# Altium integrated library Mylib Rev 4.IntLib: 207 symbols (part 1 of 3)
Pins are listed as number, name and electrical type; pins without a type are passive.

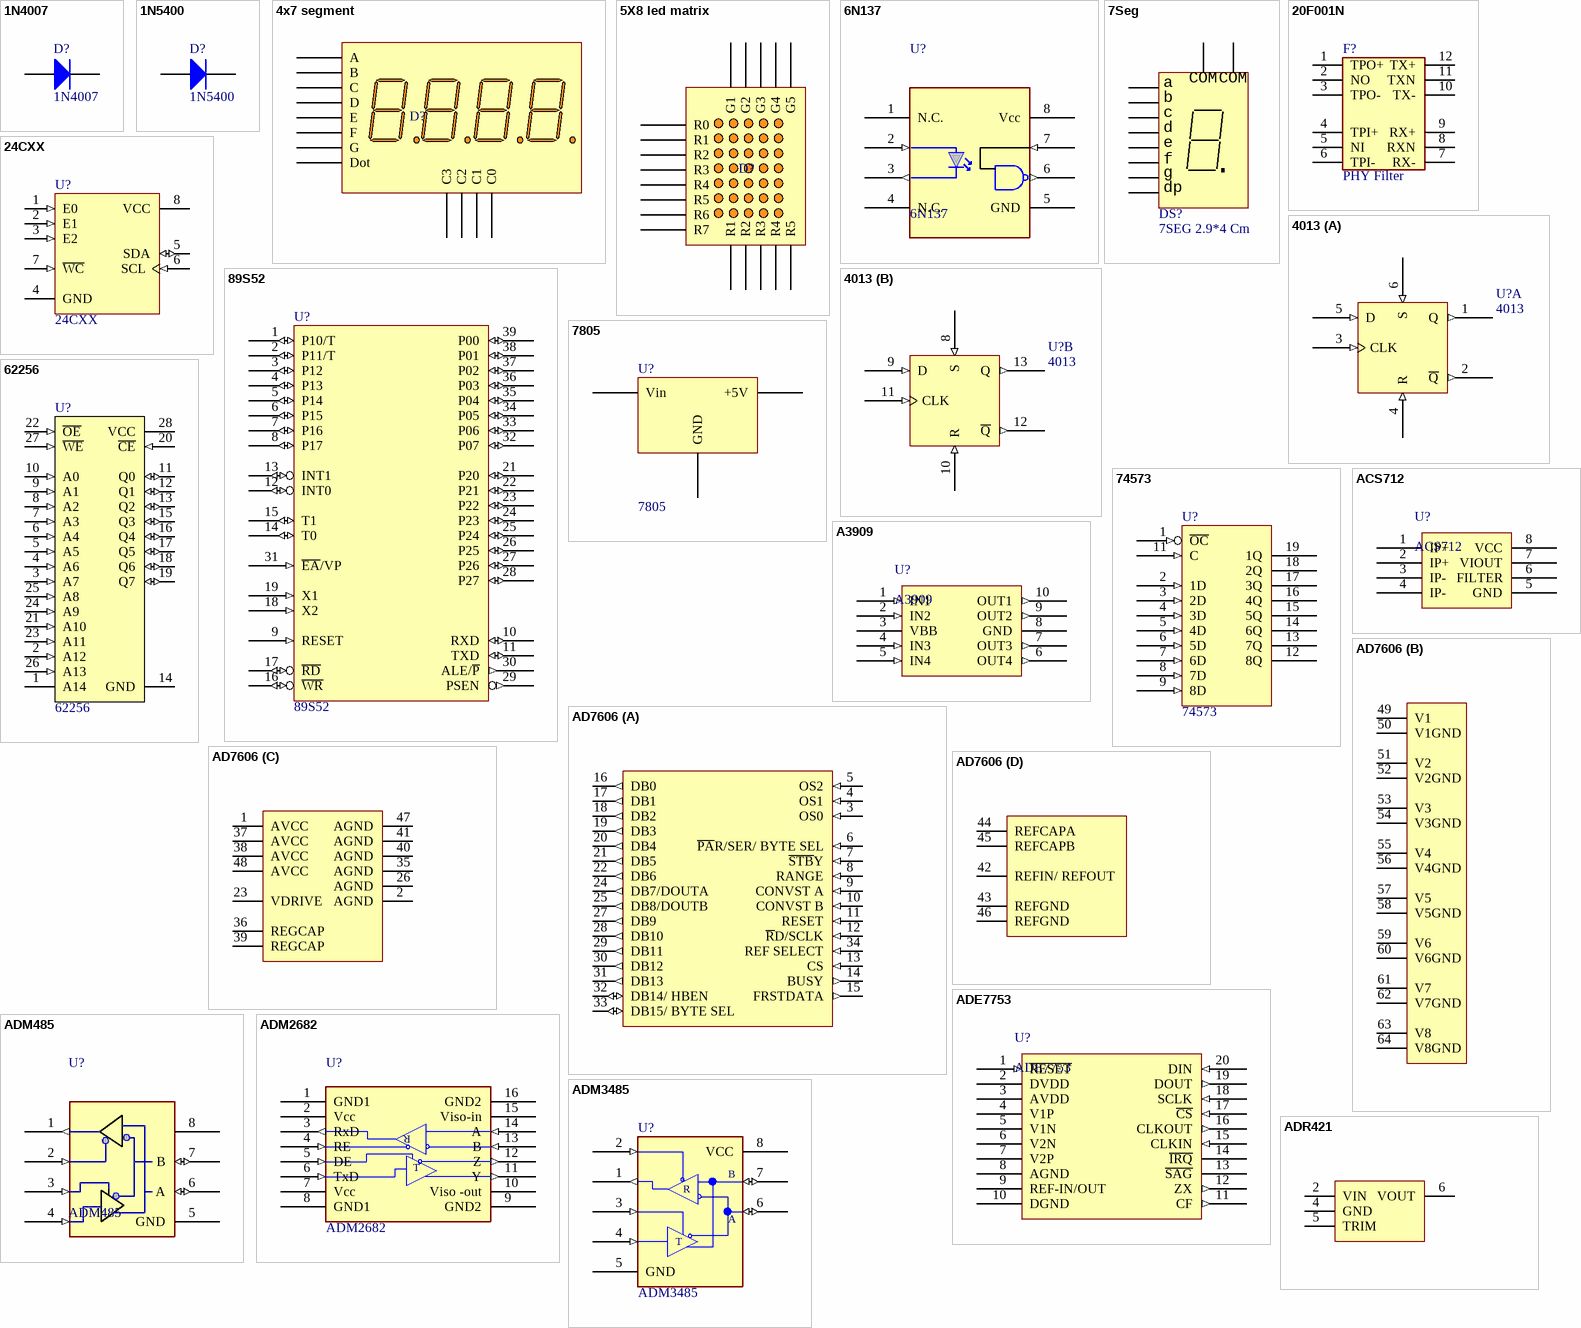
[diagram p0: symbols 1N4007 to ADR421]

## 1N4007
designator D?
1 Amp Diode; ASiD Part Number: 1n4007-AS
footprint My_DO41
footprint MY_1206_Diode
footprint MY_0805_Diode
footprint MY_1N4007_SMD
footprint My_DO41_ST
footprint MY_DO214BA
footprint MY_SMA
footprint MY_SMB
footprint MY_SMC
pins: A, K

## 1N5400
designator D?
3 Amp Diode; ASiD Part Number: 1N5408-AS
footprint My_DO201-15
pins: A, K

## 4x7 segment
designator D?, comment comon anode 4x7 segment  (value not drawn)
ASiD Part Number: -AS
footprint MY_4X7_seg
pins: 1 E, 2 D, 3 Dot, 4 C, 5 G, 6 C3, 7 B, 8 C2, 9 C1, 10 F, 11 A, 12 C0

## 5X8 led matrix
designator D?, comment Dula color 2.3 inch 5X8 dot matrix  (value not drawn)
ASiD Part Number: -AS
footprint MY_5X8_DOT_MATRIX
pins: 1 G1, 2 G2, 3 R2, 4 R3, 5 R5, 6 R6, 7 R4, 8 R4, 9 R7, 10 G5, 11 R5, 12 G4, 13 G3, 14 R3, 15 R1, 16 R0, 17 R2, 18 R1

## 6N137
designator U?
Single-Channel High Speed 10MBit/s Logic Gate Optocouplers; ASiD Part Number: 6N137-AS
footprint MY_SO8-GW300
footprint My_DIP8
pins: 1 N.C., 2 (in), 3 (out), 4 N.C., 5 GND (power), 6 (out), 7 (in), 8 Vcc (power)
2 alternate drawings of the same symbol

## 7Seg
designator DS?, comment 7SEG 2.9*4 Cm
Common Anode Seven-Segment Display, Right Hand Decimal; ASiD Part Number: 7Seg-AS
footprint My_7 seg
pins: 1 COM (power), 2 e, 3 d, 4 c, 5 COM (power), 6 b, 7 a, 8 dp, 9 f, 10 g

## 20F001N
designator F?, comment PHY Filter
ASiD Part Number: 20F001N-AS
footprint MY_20F001N
pins: 1 TPO+, 2 NO, 3 TPO-, 4 TPI+, 5 NI, 6 TPI-, 7 RX-, 8 RXN, 9 RX+, 10 TX-, 11 TXN, 12 TX+

## 24CXX
designator U?
Serial I²C Bus EEPROM; ASiD Part Number: AT24C128C-SSHM-T-AS
footprint My_DIP8
footprint My_SOIC_P8
pins: 1 E0 (in), 2 E1 (in), 3 E2 (in), 4 GND (power), 5 SDA (io), 6 SCL (in), 7 ~{WC} (in), 8 VCC (power)

## 89S52
designator U?
Atmel 89S52 Microcontroller; ASiD Part Number: 89S52-AS
footprint My_DIP40
pins: 1 P10/T (io), 2 P11/T (io), 3 P12 (io), 4 P13 (io), 5 P14 (io), 6 P15 (io), 7 P16 (io), 8 P17 (io), 9 RESET (in), 10 RXD (io), 11 TXD (io), 12 INT0 (io), 13 INT1 (io), 14 T0 (io), 15 T1 (io), 16 ~{WR} (io), 17 ~{RD} (io), 18 X2 (in), 19 X1 (in), 20 GND (power) hidden to GND, 21 P20 (io), 22 P21 (io), 23 P22 (io), 24 P23 (io), 25 P24 (io), 26 P25 (io), 27 P26 (io), 28 P27 (io), 29 PSEN (out), 30 ALE/~{P} (out), 31 ~{EA}/VP (in), 32 P07 (io), 33 P06 (io), 34 P05 (io), 35 P04 (io), 36 P03 (io), 37 P02 (io), 38 P01 (io), 39 P00 (io), 40 VCC (power) hidden to VCC

## 4013
designator U?
Doual D-type Flip-Flop; ASiD Part Number: 4013-AS
footprint My_DIP14
pins on every part: 7 GND (power) hidden to GND, 14 VCC (power) hidden to VCC
part A pins: 1 Q (out), 2 ~{Q} (out), 3 CLK (in), 4 R (in), 5 D (in), 6 S (in)
part B pins: 8 S (in), 9 D (in), 10 R (in), 11 CLK (in), 12 ~{Q} (out), 13 Q (out)

## 7805
designator U?
Regulator; ASiD Part Number: 7805-AS
footprint My_TO220
footprint MY_TO220V_heatsink
footprint MY_TO92
footprint MY_TO252
pins: 1 Vin (power), 2 GND (power), 3 +5V (power)

## 62256
designator U?
256 Kbit (32Kb X 8) Ram; ASiD Part Number: 62256-AS
footprint My_dip28
pins: 1 A14 (power), 2 A12 (in), 3 A7 (in), 4 A6 (in), 5 A5 (in), 6 A4 (in), 7 A3 (in), 8 A2 (in), 9 A1 (in), 10 A0 (in), 11 Q0 (io), 12 Q1 (io), 13 Q2 (io), 14 GND (power), 15 Q3 (io), 16 Q4 (io), 17 Q5 (io), 18 Q6 (io), 19 Q7 (io), 20 ~{CE} (in), 21 A10 (in), 22 ~{OE} (in), 23 A11 (in), 24 A9 (in), 25 A8 (in), 26 A13 (in), 27 ~{WE} (in), 28 VCC (power)

## 74573
designator U?
OCTAL D-TYPE TRANSPARENT LCH; ASiD Part Number: 74573-AS
footprint My_DIP20
pins: 1 ~{OC} (in), 2 1D (in), 3 2D (in), 4 3D (in), 5 4D (in), 6 5D (in), 7 6D (in), 8 7D (in), 9 8D (in), 10 GND (power) hidden to GND, 11 C (in), 12 8Q (hiz), 13 7Q (hiz), 14 6Q (hiz), 15 5Q (hiz), 16 4Q (hiz), 17 3Q (hiz), 18 2Q (hiz), 19 1Q (hiz), 20 VCC (power) hidden to VCC
1 alternate drawing of the same symbol

## A3909
designator U?
Dual Full Bridge Motor Driver; ASiD Part Number: A3909-AS
footprint MY_MSOP10_LY
pins: 1 IN1 (in), 2 IN2 (in), 3 VBB (power), 4 IN3 (in), 5 IN4 (in), 6 OUT4 (out), 7 OUT3 (out), 8 GND (power), 9 OUT2 (out), 10 OUT1 (out)

## ACS712
designator U?
ASiD Part Number: ACS712
footprint My_SOIC_P8
pins: 1 IP+, 2 IP+, 3 IP-, 4 IP-, 5 GND (power), 6 FILTER, 7 VIOUT, 8 VCC (power)

## AD7606
designator U?  (value not drawn)
8 Channel DAS with 16-Bit, Bipolar  Input, Simultaneous Sampling ADC; ASiD Part Number: AD7606-AS
footprint MY_LQFP64
part A pins: 3 OS0 (in), 4 OS1 (in), 5 OS2 (in), 6 ~{PA}R/SER/ BYTE SEL (in), 7 ~{STB}Y (in), 8 RANGE (in), 9 CONVST A (in), 10 CONVST B (in), 11 RESET (in), 12 ~{R}D/SCLK (in), 13 CS (in), 14 BUSY (out), 15 FRSTDATA (out), 16 DB0 (out), 17 DB1 (out), 18 DB2 (out), 19 DB3 (out), 20 DB4 (out), 21 DB5 (out), 22 DB6 (out), 24 DB7/DOUTA (out), 25 DB8/DOUTB (out), 27 DB9 (out), 28 DB10 (out), 29 DB11 (out), 30 DB12 (out), 31 DB13 (out), 32 DB14/ HBEN (io), 33 DB15/ BYTE SEL (io), 34 REF SELECT (in)
part B pins: 49 V1, 50 V1GND (power), 51 V2, 52 V2GND (power), 53 V3, 54 V3GND (power), 55 V4, 56 V4GND (power), 57 V5, 58 V5GND (power), 59 V6, 60 V6GND (power), 61 V7, 62 V7GND (power), 63 V8, 64 V8GND (power)
part C pins: 1 AVCC (power), 2 AGND (power), 23 VDRIVE (power), 26 AGND (power), 35 AGND (power), 36 REGCAP (power), 37 AVCC (power), 38 AVCC (power), 39 REGCAP (power), 40 AGND (power), 41 AGND (power), 47 AGND (power), 48 AVCC (power)
part D pins: 42 REFIN/ REFOUT, 43 REFGND (power), 44 REFCAPA, 45 REFCAPB, 46 REFGND (power)

## ADE7753
designator U?
Active and Apparent Energy Metering IC with di/dt sensor interface; ASiD Part Number: ADE7753-AS
footprint MY_SSOP20
pins: 1 ~{RESET} (in), 2 DVDD (power), 3 AVDD (power), 4 V1P, 5 V1N, 6 V2N, 7 V2P, 8 AGND (power), 9 REF-IN/OUT, 10 DGND (power), 11 CF (out), 12 ZX (out), 13 ~{SAG} (oc), 14 ~{IRQ} (oc), 15 CLKIN (in), 16 CLKOUT (out), 17 ~{CS} (in), 18 SCLK (in), 19 DOUT (out), 20 DIN (in)

## ADM485
designator U?
5 V Low Power  EIA RS-485 Transceiver; ASiD Part Number: ADM485-AS
footprint My_SOIC_P8
footprint My_DIP8
pins: 1 (out), 2 (in), 3 (in), 4 (in), 5 GND (power), 6 A (io), 7 B (io), 8 (power)

## ADM2682
designator U?
5 kV rms Signal and Power Isolated  RS-485 Transceiver with ±15 kV ESD; ASiD Part Number: ADM2682-AS
footprint MY_SOIC16W (SOIC, 16-Leads, Body 10.5x7.5mm (max), Pitch 1.27mm, IPC Medium Density)
pins: 1 GND1 (power), 2 Vcc (power), 3 RxD (out), 4 RE (in), 5 DE (in), 6 TxD (in), 7 Vcc (power), 8 GND1 (power), 9 GND2 (power), 10 Viso -out (power), 11 Y (out), 12 Z (out), 13 B (in), 14 A (in), 15 Viso-in (power), 16 GND2 (power)
text: R; T

## ADM3485
designator U?
ESD Protected, EMC Compliant, 3.3 V,  20 Mbps, EIA RS-485 Transceiver; ASiD Part Number: ADM3485-AS
footprint My_SOIC_P8
footprint My_DIP8
pins: 1 RO (out), 2 ~{R}E (in), 3 DE (in), 4 DI (in), 5 GND (power), 6 A (io), 7 B (io), 8 VCC (power)
text: R; T

## ADR421
designator U?  (value not drawn)
Ultra precision, Low Noise 2.500 V/ Voltage Reference; ASiD Part Number: ADR421-AS
footprint My_SOIC_P8
footprint MY_MSOP8
pins: 2 VIN (power), 4 GND (power), 5 TRIM, 6 VOUT

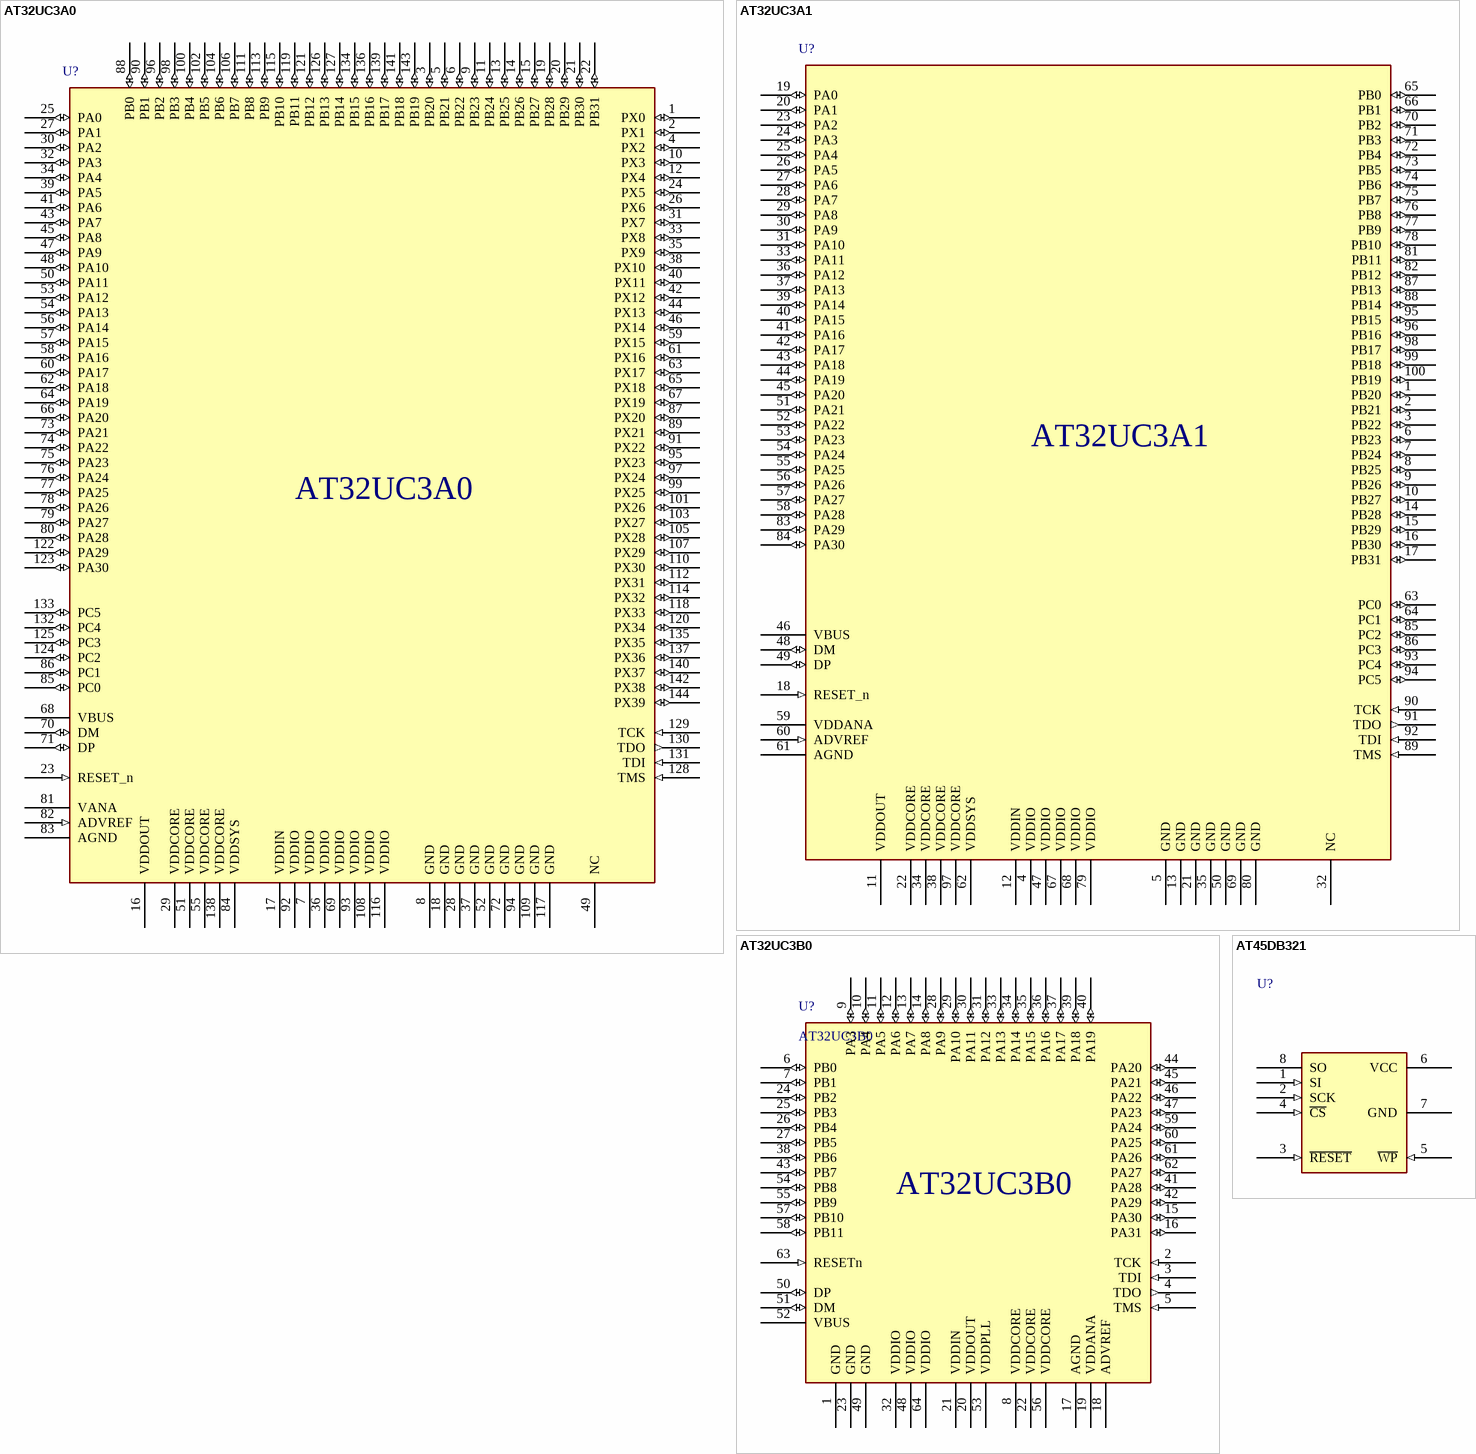
[diagram p1: symbols AT32UC3A0 to AT45DB321]

## AT32UC3A0
designator U?  (value not drawn)
AVR32 32-Bit Microcontroller; ASiD Part Number: AT32UC3A0-AS
footprint MY_TQFP144
pins: 1 PX0 (io), 2 PX1 (io), 3 PB20 (io), 4 PX2 (io), 5 PB21 (io), 6 PB22 (io), 7 VDDIO (power), 8 GND (power), 9 PB23 (io), 10 PX3 (io), 11 PB24 (io), 12 PX4 (io), 13 PB25 (io), 14 PB26 (io), 15 PB27 (io), 16 VDDOUT (power), 17 VDDIN (power), 18 GND (power), 19 PB28 (io), 20 PB29 (io), 21 PB30 (io), 22 PB31 (io), 23 RESET_n (in), 24 PX5 (io), 25 PA0 (io), 26 PX6 (io), 27 PA1 (io), 28 GND (power), 29 VDDCORE (power), 30 PA2 (io), 31 PX7 (io), 32 PA3 (io), 33 PX8 (io), 34 PA4 (io), 35 PX9 (io), 36 VDDIO (power), 37 GND (power), 38 PX10 (io), 39 PA5 (io), 40 PX11 (io), 41 PA6 (io), 42 PX12 (io), 43 PA7 (io), 44 PX13 (io), 45 PA8 (io), 46 PX14 (io), 47 PA9 (io), 48 PA10 (io), 49 NC, 50 PA11 (io), 51 VDDCORE (power), 52 GND (power), 53 PA12 (io), 54 PA13 (io), 55 VDDCORE (power), 56 PA14 (io), 57 PA15 (io), 58 PA16 (io), 59 PX15 (io), 60 PA17 (io), 61 PX16 (io), 62 PA18 (io), 63 PX17 (io), 64 PA19 (io), 65 PX18 (io), 66 PA20 (io), 67 PX19 (io), 68 VBUS (power), 69 VDDIO (power), 70 DM (io), 71 DP (io), 72 GND (power), 73 PA21 (io), 74 PA22 (io), 75 PA23 (io), 76 PA24 (io), 77 PA25 (io), 78 PA26 (io), 79 PA27 (io), 80 PA28 (io), 81 VANA, 82 ADVREF (in), 83 AGND (power), 84 VDDSYS (power), 85 PC0 (io), 86 PC1 (io), 87 PX20 (io), 88 PB0 (io), 89 PX21 (io), 90 PB1 (io), 91 PX22 (io), 92 VDDIO (power), 93 VDDIO (power), 94 GND (power), 95 PX23 (io), 96 PB2 (io), 97 PX24 (io), 98 PB3 (io), 99 PX25 (io), 100 PB4 (io), 101 PX26 (io), 102 PB5 (io), 103 PX27 (io), 104 PB6 (io), 105 PX28 (io), 106 PB7 (io), 107 PX29 (io), 108 VDDIO (power), 109 GND (power), 110 PX30 (io), 111 PB8 (io), 112 PX31 (io), 113 PB9 (io), 114 PX32 (io), 115 PB10 (io), 116 VDDIO (power), 117 GND (power), 118 PX33 (io), 119 PB11 (io), 120 PX34 (io), 121 PB12 (io), 122 PA29 (io), 123 PA30 (io), 124 PC2 (io), 125 PC3 (io), 126 PB13 (io), 127 PB14 (io), 128 TMS (in), 129 TCK (in), 130 TDO (out), 131 TDI (in), 132 PC4 (io), 133 PC5 (io), 134 PB15 (io), 135 PX35 (io), 136 PB16 (io), 137 PX36 (io), 138 VDDCORE (power), 139 PB17 (io), 140 PX37 (io), 141 PB18 (io), 142 PX38 (io), 143 PB19 (io), 144 PX39 (io)

## AT32UC3A1
designator U?  (value not drawn)
AVR32 32-Bit Microcontroller; ASiD Part Number: AT32UC3A1-AS
footprint MY_TQFP100
pins: 1 PB20 (io), 2 PB21 (io), 3 PB22 (io), 4 VDDIO (power), 5 GND (power), 6 PB23 (io), 7 PB24 (io), 8 PB25 (io), 9 PB26 (io), 10 PB27 (io), 11 VDDOUT (power), 12 VDDIN (power), 13 GND (power), 14 PB28 (io), 15 PB29 (io), 16 PB30 (io), 17 PB31 (io), 18 RESET_n (in), 19 PA0 (io), 20 PA1 (io), 21 GND (power), 22 VDDCORE (power), 23 PA2 (io), 24 PA3 (io), 25 PA4 (io), 26 PA5 (io), 27 PA6 (io), 28 PA7 (io), 29 PA8 (io), 30 PA9 (io), 31 PA10 (io), 32 NC, 33 PA11 (io), 34 VDDCORE (power), 35 GND (power), 36 PA12 (io), 37 PA13 (io), 38 VDDCORE (power), 39 PA14 (io), 40 PA15 (io), 41 PA16 (io), 42 PA17 (io), 43 PA18 (io), 44 PA19 (io), 45 PA20 (io), 46 VBUS (power), 47 VDDIO (power), 48 DM (io), 49 DP (io), 50 GND (power), 51 PA21 (io), 52 PA22 (io), 53 PA23 (io), 54 PA24 (io), 55 PA25 (io), 56 PA26 (io), 57 PA27 (io), 58 PA28 (io), 59 VDDANA, 60 ADVREF (in), 61 AGND (power), 62 VDDSYS (power), 63 PC0 (io), 64 PC1 (io), 65 PB0 (io), 66 PB1 (io), 67 VDDIO (power), 68 VDDIO (power), 69 GND (power), 70 PB2 (io), 71 PB3 (io), 72 PB4 (io), 73 PB5 (io), 74 PB6 (io), 75 PB7 (io), 76 PB8 (io), 77 PB9 (io), 78 PB10 (io), 79 VDDIO (power), 80 GND (power), 81 PB11 (io), 82 PB12 (io), 83 PA29 (io), 84 PA30 (io), 85 PC2 (io), 86 PC3 (io), 87 PB13 (io), 88 PB14 (io), 89 TMS (in), 90 TCK (in), 91 TDO (out), 92 TDI (in), 93 PC4 (io), 94 PC5 (io), 95 PB15 (io), 96 PB16 (io), 97 VDDCORE (power), 98 PB17 (io), 99 PB18 (io), 100 PB19 (io)

## AT32UC3B0
designator U?
AVR32 32-Bit Microcontroller; ASiD Part Number: AT32UC3B0-AS
footprint My_TQFP64
pins: 1 GND, 2 TCK (in), 3 TDI (in), 4 TDO (out), 5 TMS (in), 6 PB0 (io), 7 PB1 (io), 8 VDDCORE, 9 PA3 (io), 10 PA4 (io), 11 PA5 (io), 12 PA6 (io), 13 PA7 (io), 14 PA8 (io), 15 PA30 (io), 16 PA31 (io), 17 AGND, 18 ADVREF, 19 VDDANA, 20 VDDOUT, 21 VDDIN, 22 VDDCORE, 23 GND, 24 PB2 (io), 25 PB3 (io), 26 PB4 (io), 27 PB5 (io), 28 PA9 (io), 29 PA10 (io), 30 PA11 (io), 31 PA12 (io), 32 VDDIO, 33 PA13 (io), 34 PA14 (io), 35 PA15 (io), 36 PA16 (io), 37 PA17 (io), 38 PB6 (io), 39 PA18 (io), 40 PA19 (io), 41 PA28 (io), 42 PA29 (io), 43 PB7 (io), 44 PA20 (io), 45 PA21 (io), 46 PA22 (io), 47 PA23 (io), 48 VDDIO, 49 GND, 50 DP (io), 51 DM (io), 52 VBUS, 53 VDDPLL, 54 PB8 (io), 55 PB9 (io), 56 VDDCORE, 57 PB10 (io), 58 PB11 (io), 59 PA24 (io), 60 PA25 (io), 61 PA26 (io), 62 PA27 (io), 63 RESETn (in), 64 VDDIO

## AT45DB321
designator U?, comment Atmel Serial Data flash  (value not drawn)
ASiD Part Number: AT45DB321-AS
footprint My_SOIC_P8
pins: 1 SI (in), 2 SCK (in), 3 ~{RESET} (in), 4 ~{CS} (in), 5 ~{WP} (in), 6 VCC (power), 7 GND (power), 8 SO (hiz)

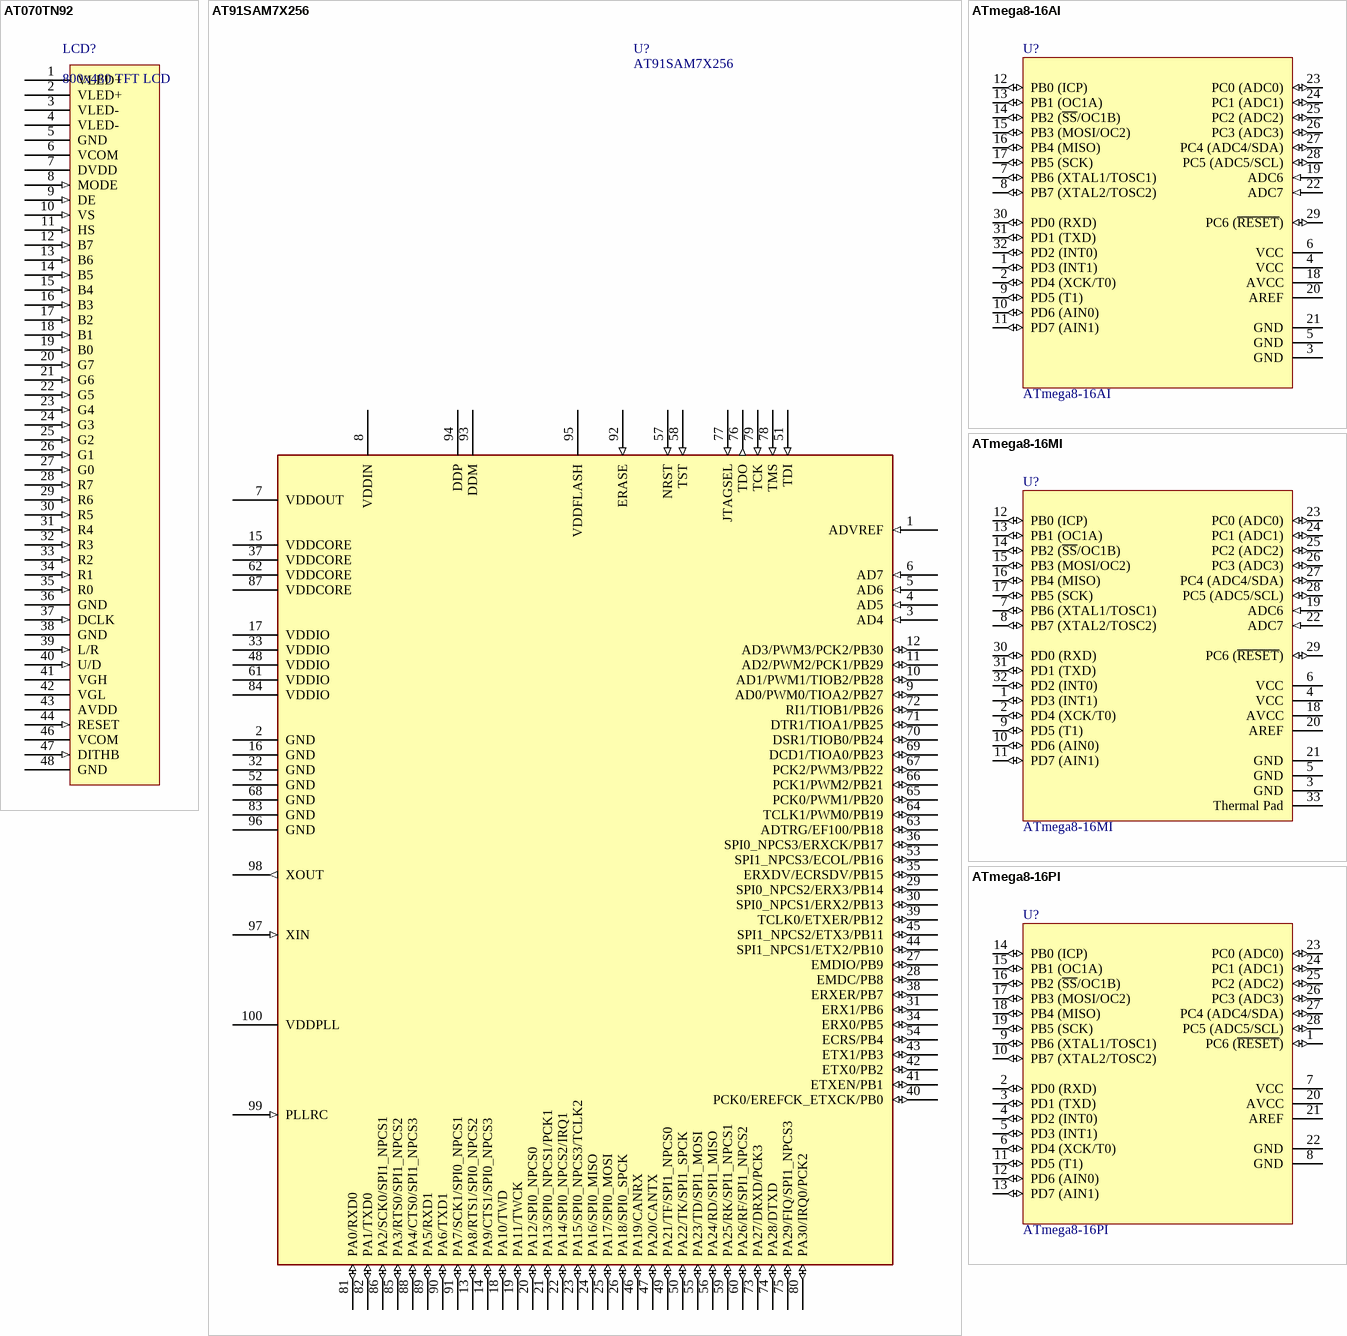
[diagram p2: symbols AT070TN92 to ATmega8-16PI]

## AT070TN92
designator LCD?, comment 800x480 TFT LCD
ASiD Part Number: AT070TN92-AS
footprint MY_FPC50
pins: 1 VLED+, 2 VLED+, 3 VLED-, 4 VLED-, 5 GND, 6 VCOM, 7 DVDD, 8 MODE (in), 9 DE (in), 10 VS (in), 11 HS (in), 12 B7 (in), 13 B6 (in), 14 B5 (in), 15 B4 (in), 16 B3 (in), 17 B2 (in), 18 B1 (in), 19 B0 (in), 20 G7 (in), 21 G6 (in), 22 G5 (in), 23 G4 (in), 24 G3 (in), 25 G2 (in), 26 G1 (in), 27 G0 (in), 28 R7 (in), 29 R6 (in), 30 R5 (in), 31 R4 (in), 32 R3 (in), 33 R2 (in), 34 R1 (in), 35 R0 (in), 36 GND, 37 DCLK (in), 38 GND, 39 L/R (in), 40 U/D (in), 41 VGH, 42 VGL, 43 AVDD, 44 RESET (in), 46 VCOM, 47 DITHB (in), 48 GND

## AT91SAM7X256
designator U?
ARM7 256K Bytes of In-System Programmable Flash Memory; ASiD Part Number: AT91SAM7X256-AS
footprint MY_TQFP100
pins: 1 ADVREF (in), 2 GND (power), 3 AD4 (in), 4 AD5 (in), 5 AD6 (in), 6 AD7 (in), 7 VDDOUT (power), 8 VDDIN (power), 9 AD0/PWM0/TIOA2/PB27 (io), 10 AD1/PWM1/TIOB2/PB28 (io), 11 AD2/PWM2/PCK1/PB29 (io), 12 AD3/PWM3/PCK2/PB30 (io), 13 PA8/RTS1/SPI0_NPCS2 (io), 14 PA9/CTS1/SPI0_NPCS3 (io), 15 VDDCORE (power), 16 GND (power), 17 VDDIO (power), 18 PA10/TWD (io), 19 PA11/TWCK (io), 20 PA12/SPI0_NPCS0 (io), 21 PA13/SPI0_NPCS1/PCK1 (io), 22 PA14/SPI0_NPCS2/IRQ1 (io), 23 PA15/SPI0_NPCS3/TCLK2 (io), 24 PA16/SPI0_MISO (io), 25 PA17/SPI0_MOSI (io), 26 PA18/SPI0_SPCK (io), 27 EMDIO/PB9 (io), 28 EMDC/PB8 (io), 29 SPI0_NPCS2/ERX3/PB14 (io), 30 SPI0_NPCS1/ERX2/PB13 (io), 31 ERX1/PB6 (io), 32 GND (power), 33 VDDIO (power), 34 ERX0/PB5 (io), 35 ERXDV/ECRSDV/PB15 (io), 36 SPI0_NPCS3/ERXCK/PB17 (io), 37 VDDCORE (power), 38 ERXER/PB7 (io), 39 TCLK0/ETXER/PB12 (io), 40 PCK0/EREFCK_ETXCK/PB0 (io), 41 ETXEN/PB1 (io), 42 ETX0/PB2 (io), 43 ETX1/PB3 (io), 44 SPI1_NPCS1/ETX2/PB10 (io), 45 SPI1_NPCS2/ETX3/PB11 (io), 46 PA19/CANRX (io), 47 PA20/CANTX (io), 48 VDDIO (power), 49 PA21/TF/SPI1_NPCS0 (io), 50 PA22/TK/SPI1_SPCK (io), 51 TDI (in), 52 GND (power), 53 SPI1_NPCS3/ECOL/PB16 (io), 54 ECRS/PB4 (io), 55 PA23/TD/SPI1_MOSI (io), 56 PA24/RD/SPI1_MISO (io), 57 NRST (in), 58 TST (in), 59 PA25/RK/SPI1_NPCS1 (io), 60 PA26/RF/SPI1_NPCS2 (io), 61 VDDIO (power), 62 VDDCORE (power), 63 ADTRG/EF100/PB18 (io), 64 TCLK1/PWM0/PB19 (io), 65 PCK0/PWM1/PB20 (io), 66 PCK1/PWM2/PB21 (io), 67 PCK2/PWM3/PB22 (io), 68 GND (power), 69 DCD1/TIOA0/PB23 (io), 70 DSR1/TIOB0/PB24 (io), 71 DTR1/TIOA1/PB25 (io), 72 RI1/TIOB1/PB26 (io), 73 PA27/DRXD/PCK3 (io), 74 PA28/DTXD (io), 75 PA29/FIQ/SPI1_NPCS3 (io), 76 TDO (out), 77 JTAGSEL (in), 78 TMS (in), 79 TCK (in), 80 PA30/IRQ0/PCK2 (io), 81 PA0/RXD0 (io), 82 PA1/TXD0 (io), 83 GND (power), 84 VDDIO (power), 85 PA3/RTS0/SPI1_NPCS2 (io), 86 PA2/SCK0/SPI1_NPCS1 (io), 87 VDDCORE (power), 88 PA4/CTS0/SPI1_NPCS3 (io), 89 PA5/RXD1 (io), 90 PA6/TXD1 (io), 91 PA7/SCK1/SPI0_NPCS1 (io), 92 ERASE (in), 93 DDM, 94 DDP, 95 VDDFLASH (power), 96 GND (power), 97 XIN (in), 98 XOUT (out), 99 PLLRC (in), 100 VDDPLL (power)

## ATmega8-16AI
designator U?
AVR 8K Bytes of In-System Programmable Flash Memory; ASiD Part Number: ATmega8-16AI-AS
footprint My_TQFP32
pins: 1 PD3 (INT1) (io), 2 PD4 (XCK/T0) (io), 3 GND (power), 4 VCC (power), 5 GND (power), 6 VCC (power), 7 PB6 (XTAL1/TOSC1) (io), 8 PB7 (XTAL2/TOSC2) (io), 9 PD5 (T1) (io), 10 PD6 (AIN0) (io), 11 PD7 (AIN1) (io), 12 PB0 (ICP) (io), 13 PB1 (OC1A) (io), 14 PB2 (~{SS}/OC1B) (io), 15 PB3 (MOSI/OC2) (io), 16 PB4 (MISO) (io), 17 PB5 (SCK) (io), 18 AVCC (power), 19 ADC6 (in), 20 AREF, 21 GND (power), 22 ADC7 (in), 23 PC0 (ADC0) (io), 24 PC1 (ADC1) (io), 25 PC2 (ADC2) (io), 26 PC3 (ADC3) (io), 27 PC4 (ADC4/SDA) (io), 28 PC5 (ADC5/SCL) (io), 29 PC6 (~{RESET}) (io), 30 PD0 (RXD) (io), 31 PD1 (TXD) (io), 32 PD2 (INT0) (io)

## ATmega8-16MI
designator U?
AVR 8K Bytes of In-System Programmable Flash Memory; ASiD Part Number: ATmega8-16MI-AS
footprint MY_QFN32
pins: 1 PD3 (INT1) (io), 2 PD4 (XCK/T0) (io), 3 GND (power), 4 VCC (power), 5 GND (power), 6 VCC (power), 7 PB6 (XTAL1/TOSC1) (io), 8 PB7 (XTAL2/TOSC2) (io), 9 PD5 (T1) (io), 10 PD6 (AIN0) (io), 11 PD7 (AIN1) (io), 12 PB0 (ICP) (io), 13 PB1 (OC1A) (io), 14 PB2 (~{SS}/OC1B) (io), 15 PB3 (MOSI/OC2) (io), 16 PB4 (MISO) (io), 17 PB5 (SCK) (io), 18 AVCC (power), 19 ADC6 (in), 20 AREF, 21 GND (power), 22 ADC7 (in), 23 PC0 (ADC0) (io), 24 PC1 (ADC1) (io), 25 PC2 (ADC2) (io), 26 PC3 (ADC3) (io), 27 PC4 (ADC4/SDA) (io), 28 PC5 (ADC5/SCL) (io), 29 PC6 (~{RESET}) (io), 30 PD0 (RXD) (io), 31 PD1 (TXD) (io), 32 PD2 (INT0) (io), 33 Thermal Pad (power)

## ATmega8-16PI
designator U?
AVR 8K Bytes of In-System Programmable Flash Memory; ASiD Part Number: ATmega8-16PI-AS
footprint My_DIP28_300
pins: 1 PC6 (~{RESET}) (io), 2 PD0 (RXD) (io), 3 PD1 (TXD) (io), 4 PD2 (INT0) (io), 5 PD3 (INT1) (io), 6 PD4 (XCK/T0) (io), 7 VCC (power), 8 GND (power), 9 PB6 (XTAL1/TOSC1) (io), 10 PB7 (XTAL2/TOSC2) (io), 11 PD5 (T1) (io), 12 PD6 (AIN0) (io), 13 PD7 (AIN1) (io), 14 PB0 (ICP) (io), 15 PB1 (OC1A) (io), 16 PB2 (~{SS}/OC1B) (io), 17 PB3 (MOSI/OC2) (io), 18 PB4 (MISO) (io), 19 PB5 (SCK) (io), 20 AVCC (power), 21 AREF, 22 GND (power), 23 PC0 (ADC0) (io), 24 PC1 (ADC1) (io), 25 PC2 (ADC2) (io), 26 PC3 (ADC3) (io), 27 PC4 (ADC4/SDA) (io), 28 PC5 (ADC5/SCL) (io)

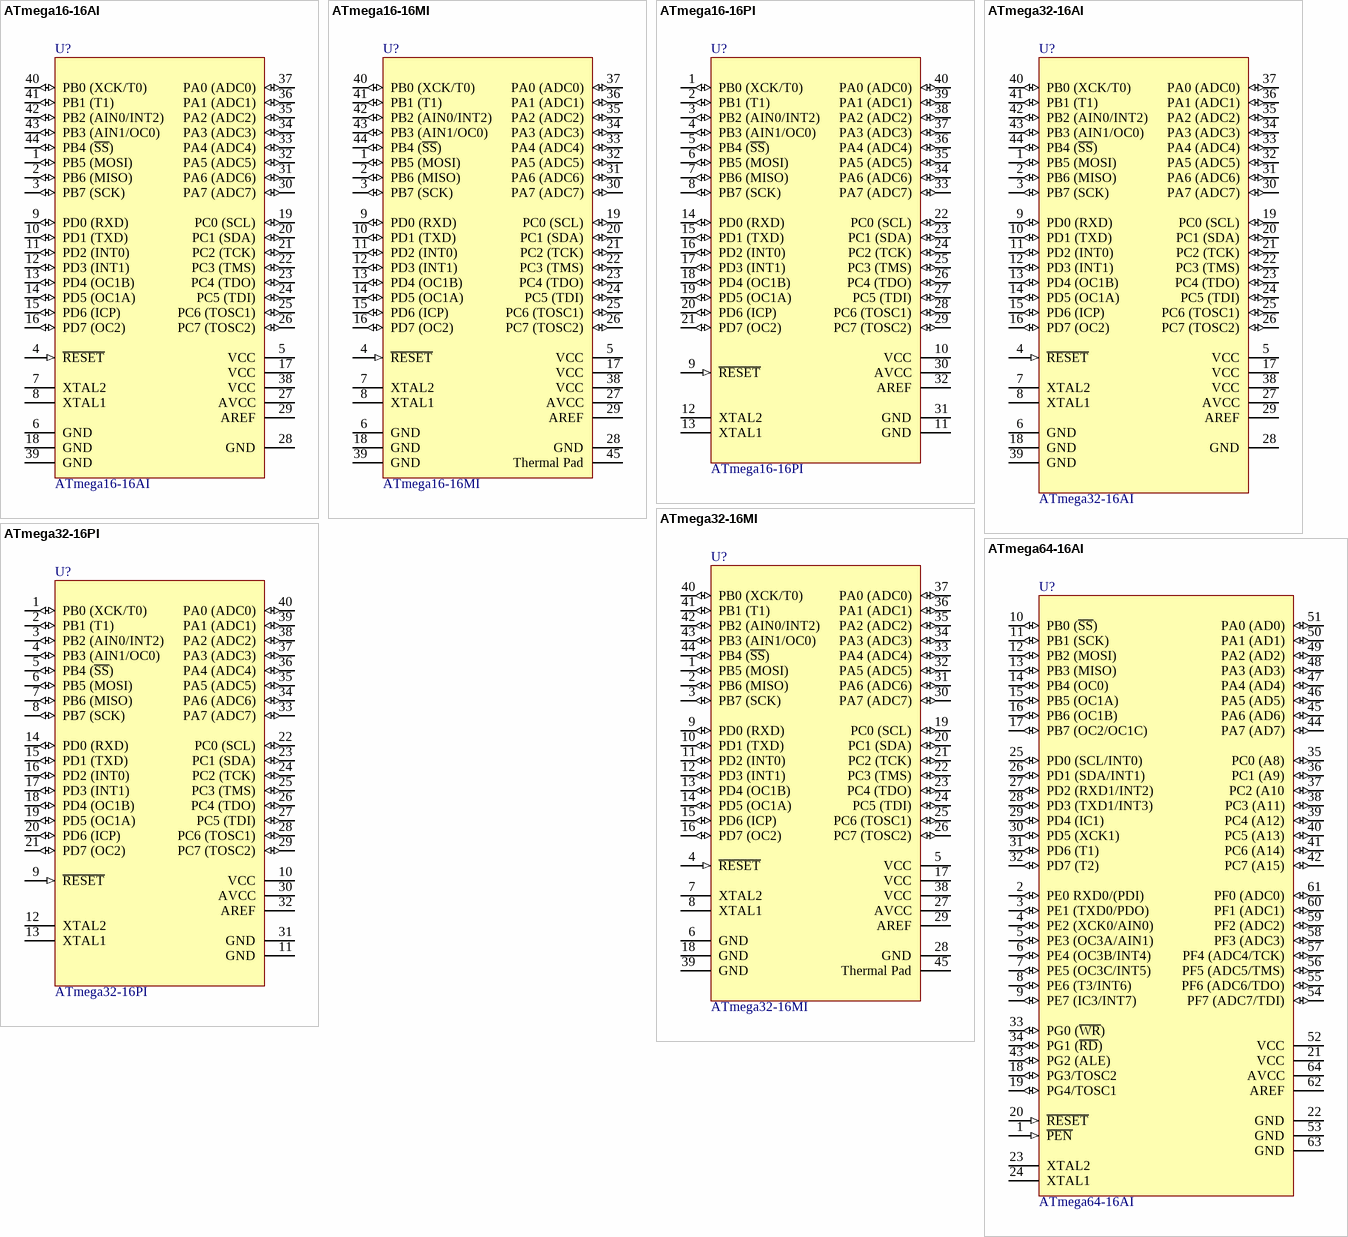
[diagram p3: symbols ATmega16-16AI to ATmega64-16AI]

## ATmega16-16AI
designator U?
AVR 16K Bytes of In-System Programmable Flash Memory; ASiD Part Number: ATmega16-16AI-AS
footprint MY_LQFP44
pins: 1 PB5 (MOSI) (io), 2 PB6 (MISO) (io), 3 PB7 (SCK) (io), 4 ~{RESET} (in), 5 VCC (power), 6 GND (power), 7 XTAL2, 8 XTAL1, 9 PD0 (RXD) (io), 10 PD1 (TXD) (io), 11 PD2 (INT0) (io), 12 PD3 (INT1) (io), 13 PD4 (OC1B) (io), 14 PD5 (OC1A) (io), 15 PD6 (ICP) (io), 16 PD7 (OC2) (io), 17 VCC (power), 18 GND (power), 19 PC0 (SCL) (io), 20 PC1 (SDA) (io), 21 PC2 (TCK) (io), 22 PC3 (TMS) (io), 23 PC4 (TDO) (io), 24 PC5 (TDI) (io), 25 PC6 (TOSC1) (io), 26 PC7 (TOSC2) (io), 27 AVCC (power), 28 GND (power), 29 AREF, 30 PA7 (ADC7) (io), 31 PA6 (ADC6) (io), 32 PA5 (ADC5) (io), 33 PA4 (ADC4) (io), 34 PA3 (ADC3) (io), 35 PA2 (ADC2) (io), 36 PA1 (ADC1) (io), 37 PA0 (ADC0) (io), 38 VCC (power), 39 GND (power), 40 PB0 (XCK/T0) (io), 41 PB1 (T1) (io), 42 PB2 (AIN0/INT2) (io), 43 PB3 (AIN1/OC0) (io), 44 PB4 (~{SS}) (io)

## ATmega16-16MI
designator U?
AVR 16K Bytes of In-System Programmable Flash Memory; ASiD Part Number: ATmega16-16MI-AS
footprint My_QFN44
pins: 1 PB5 (MOSI) (io), 2 PB6 (MISO) (io), 3 PB7 (SCK) (io), 4 ~{RESET} (in), 5 VCC (power), 6 GND (power), 7 XTAL2, 8 XTAL1, 9 PD0 (RXD) (io), 10 PD1 (TXD) (io), 11 PD2 (INT0) (io), 12 PD3 (INT1) (io), 13 PD4 (OC1B) (io), 14 PD5 (OC1A) (io), 15 PD6 (ICP) (io), 16 PD7 (OC2) (io), 17 VCC (power), 18 GND (power), 19 PC0 (SCL) (io), 20 PC1 (SDA) (io), 21 PC2 (TCK) (io), 22 PC3 (TMS) (io), 23 PC4 (TDO) (io), 24 PC5 (TDI) (io), 25 PC6 (TOSC1) (io), 26 PC7 (TOSC2) (io), 27 AVCC (power), 28 GND (power), 29 AREF, 30 PA7 (ADC7) (io), 31 PA6 (ADC6) (io), 32 PA5 (ADC5) (io), 33 PA4 (ADC4) (io), 34 PA3 (ADC3) (io), 35 PA2 (ADC2) (io), 36 PA1 (ADC1) (io), 37 PA0 (ADC0) (io), 38 VCC (power), 39 GND (power), 40 PB0 (XCK/T0) (io), 41 PB1 (T1) (io), 42 PB2 (AIN0/INT2) (io), 43 PB3 (AIN1/OC0) (io), 44 PB4 (~{SS}) (io), 45 Thermal Pad (power)

## ATmega16-16PI
designator U?
AVR 16K Bytes of In-System Programmable Flash Memory; ASiD Part Number: ATmega16-16PI-AS
footprint My_DIP40
pins: 1 PB0 (XCK/T0) (io), 2 PB1 (T1) (io), 3 PB2 (AIN0/INT2) (io), 4 PB3 (AIN1/OC0) (io), 5 PB4 (~{SS}) (io), 6 PB5 (MOSI) (io), 7 PB6 (MISO) (io), 8 PB7 (SCK) (io), 9 ~{RESET} (in), 10 VCC (power), 11 GND (power), 12 XTAL2, 13 XTAL1, 14 PD0 (RXD) (io), 15 PD1 (TXD) (io), 16 PD2 (INT0) (io), 17 PD3 (INT1) (io), 18 PD4 (OC1B) (io), 19 PD5 (OC1A) (io), 20 PD6 (ICP) (io), 21 PD7 (OC2) (io), 22 PC0 (SCL) (io), 23 PC1 (SDA) (io), 24 PC2 (TCK) (io), 25 PC3 (TMS) (io), 26 PC4 (TDO) (io), 27 PC5 (TDI) (io), 28 PC6 (TOSC1) (io), 29 PC7 (TOSC2) (io), 30 AVCC (power), 31 GND (power), 32 AREF, 33 PA7 (ADC7) (io), 34 PA6 (ADC6) (io), 35 PA5 (ADC5) (io), 36 PA4 (ADC4) (io), 37 PA3 (ADC3) (io), 38 PA2 (ADC2) (io), 39 PA1 (ADC1) (io), 40 PA0 (ADC0) (io)

## ATmega32-16AI
designator U?
AVR 32K Bytes of In-System Programmable Flash Memory; ASiD Part Number: ATmega32-16AI-AS
footprint MY_LQFP44
pins: 1 PB5 (MOSI) (io), 2 PB6 (MISO) (io), 3 PB7 (SCK) (io), 4 ~{RESET} (in), 5 VCC (power), 6 GND (power), 7 XTAL2, 8 XTAL1, 9 PD0 (RXD) (io), 10 PD1 (TXD) (io), 11 PD2 (INT0) (io), 12 PD3 (INT1) (io), 13 PD4 (OC1B) (io), 14 PD5 (OC1A) (io), 15 PD6 (ICP) (io), 16 PD7 (OC2) (io), 17 VCC (power), 18 GND (power), 19 PC0 (SCL) (io), 20 PC1 (SDA) (io), 21 PC2 (TCK) (io), 22 PC3 (TMS) (io), 23 PC4 (TDO) (io), 24 PC5 (TDI) (io), 25 PC6 (TOSC1) (io), 26 PC7 (TOSC2) (io), 27 AVCC (power), 28 GND (power), 29 AREF, 30 PA7 (ADC7) (io), 31 PA6 (ADC6) (io), 32 PA5 (ADC5) (io), 33 PA4 (ADC4) (io), 34 PA3 (ADC3) (io), 35 PA2 (ADC2) (io), 36 PA1 (ADC1) (io), 37 PA0 (ADC0) (io), 38 VCC (power), 39 GND (power), 40 PB0 (XCK/T0) (io), 41 PB1 (T1) (io), 42 PB2 (AIN0/INT2) (io), 43 PB3 (AIN1/OC0) (io), 44 PB4 (~{SS}) (io)

## ATmega32-16MI
designator U?
AVR 32K Bytes of In-System Programmable Flash Memory; ASiD Part Number: ATmega32-16MI-AS
footprint My_QFN44
pins: 1 PB5 (MOSI) (io), 2 PB6 (MISO) (io), 3 PB7 (SCK) (io), 4 ~{RESET} (in), 5 VCC (power), 6 GND (power), 7 XTAL2, 8 XTAL1, 9 PD0 (RXD) (io), 10 PD1 (TXD) (io), 11 PD2 (INT0) (io), 12 PD3 (INT1) (io), 13 PD4 (OC1B) (io), 14 PD5 (OC1A) (io), 15 PD6 (ICP) (io), 16 PD7 (OC2) (io), 17 VCC (power), 18 GND (power), 19 PC0 (SCL) (io), 20 PC1 (SDA) (io), 21 PC2 (TCK) (io), 22 PC3 (TMS) (io), 23 PC4 (TDO) (io), 24 PC5 (TDI) (io), 25 PC6 (TOSC1) (io), 26 PC7 (TOSC2) (io), 27 AVCC (power), 28 GND (power), 29 AREF, 30 PA7 (ADC7) (io), 31 PA6 (ADC6) (io), 32 PA5 (ADC5) (io), 33 PA4 (ADC4) (io), 34 PA3 (ADC3) (io), 35 PA2 (ADC2) (io), 36 PA1 (ADC1) (io), 37 PA0 (ADC0) (io), 38 VCC (power), 39 GND (power), 40 PB0 (XCK/T0) (io), 41 PB1 (T1) (io), 42 PB2 (AIN0/INT2) (io), 43 PB3 (AIN1/OC0) (io), 44 PB4 (~{SS}) (io), 45 Thermal Pad (power)

## ATmega32-16PI
designator U?
AVR 32K Bytes of In-System Programmable Flash Memory; ASiD Part Number: ATmega32-16PI-AS
footprint My_DIP40
pins: 1 PB0 (XCK/T0) (io), 2 PB1 (T1) (io), 3 PB2 (AIN0/INT2) (io), 4 PB3 (AIN1/OC0) (io), 5 PB4 (~{SS}) (io), 6 PB5 (MOSI) (io), 7 PB6 (MISO) (io), 8 PB7 (SCK) (io), 9 ~{RESET} (in), 10 VCC (power), 11 GND (power), 12 XTAL2, 13 XTAL1, 14 PD0 (RXD) (io), 15 PD1 (TXD) (io), 16 PD2 (INT0) (io), 17 PD3 (INT1) (io), 18 PD4 (OC1B) (io), 19 PD5 (OC1A) (io), 20 PD6 (ICP) (io), 21 PD7 (OC2) (io), 22 PC0 (SCL) (io), 23 PC1 (SDA) (io), 24 PC2 (TCK) (io), 25 PC3 (TMS) (io), 26 PC4 (TDO) (io), 27 PC5 (TDI) (io), 28 PC6 (TOSC1) (io), 29 PC7 (TOSC2) (io), 30 AVCC (power), 31 GND (power), 32 AREF, 33 PA7 (ADC7) (io), 34 PA6 (ADC6) (io), 35 PA5 (ADC5) (io), 36 PA4 (ADC4) (io), 37 PA3 (ADC3) (io), 38 PA2 (ADC2) (io), 39 PA1 (ADC1) (io), 40 PA0 (ADC0) (io)

## ATmega64-16AI
designator U?
AVR 64K Bytes of In-System Programmable Flash Memory; ASiD Part Number: ATmega64-16AI-AS
footprint My_TQFP64
pins: 1 ~{PEN} (in), 2 PE0 RXD0/(PDI) (io), 3 PE1 (TXD0/PDO) (io), 4 PE2 (XCK0/AIN0) (io), 5 PE3 (OC3A/AIN1) (io), 6 PE4 (OC3B/INT4) (io), 7 PE5 (OC3C/INT5) (io), 8 PE6 (T3/INT6) (io), 9 PE7 (IC3/INT7) (io), 10 PB0 (~{SS}) (io), 11 PB1 (SCK) (io), 12 PB2 (MOSI) (io), 13 PB3 (MISO) (io), 14 PB4 (OC0) (io), 15 PB5 (OC1A) (io), 16 PB6 (OC1B) (io), 17 PB7 (OC2/OC1C) (io), 18 PG3/TOSC2 (io), 19 PG4/TOSC1 (io), 20 ~{RESET} (in), 21 VCC (power), 22 GND (power), 23 XTAL2, 24 XTAL1, 25 PD0 (SCL/INT0) (io), 26 PD1 (SDA/INT1) (io), 27 PD2 (RXD1/INT2) (io), 28 PD3 (TXD1/INT3) (io), 29 PD4 (IC1) (io), 30 PD5 (XCK1) (io), 31 PD6 (T1) (io), 32 PD7 (T2) (io), 33 PG0 (~{WR}) (io), 34 PG1 (~{RD}) (io), 35 PC0 (A8) (io), 36 PC1 (A9) (io), 37 PC2 (A10 (io), 38 PC3 (A11) (io), 39 PC4 (A12) (io), 40 PC5 (A13) (io), 41 PC6 (A14) (io), 42 PC7 (A15) (io), 43 PG2 (ALE) (io), 44 PA7 (AD7) (io), 45 PA6 (AD6) (io), 46 PA5 (AD5) (io), 47 PA4 (AD4) (io), 48 PA3 (AD3) (io), 49 PA2 (AD2) (io), 50 PA1 (AD1) (io), 51 PA0 (AD0) (io), 52 VCC (power), 53 GND (power), 54 PF7 (ADC7/TDI) (io), 55 PF6 (ADC6/TDO) (io), 56 PF5 (ADC5/TMS) (io), 57 PF4 (ADC4/TCK) (io), 58 PF3 (ADC3) (io), 59 PF2 (ADC2) (io), 60 PF1 (ADC1) (io), 61 PF0 (ADC0) (io), 62 AREF, 63 GND (power), 64 AVCC (power)